# Altium integrated library Diode_Mos_Power_lib.IntLib: 39 symbols
Pins are listed as number, name and electrical type; pins without a type are passive.

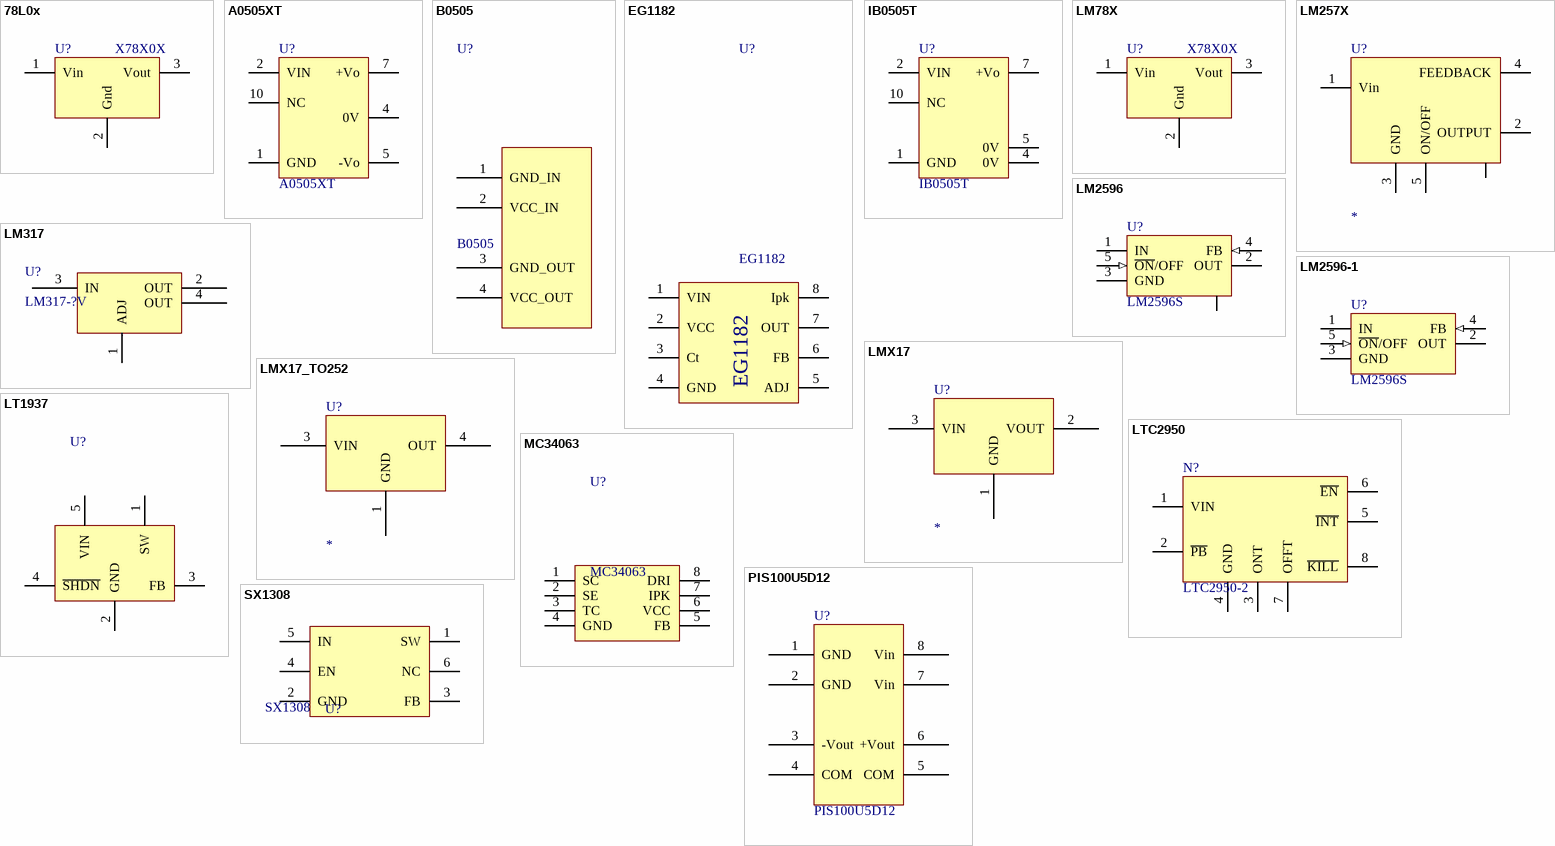
[diagram p0: symbols 78L0x to SX1308]

## 78L0x
designator U?, comment X78X0X
正电压等级转换器IC，电压等级有：5,6,8,9,12,15,24
footprint 7805
footprint TO-220
footprint lm7805
footprint SOT223
pins: 1 Vin, 2 Gnd, 3 Vout

## A0505XT
designator U?
隔离电源模块
footprint SO10_IB0505
pins: 1 GND, 2 VIN, 4 0V, 5 -Vo, 7 +Vo, 10 NC

## B0505
designator U?
隔离电源模块
footprint DC-DC_SIP4
pins: 1 GND_IN, 2 VCC_IN, 3 GND_OUT, 4 VCC_OUT
2 alternate drawings of the same symbol

## EG1182
designator U?
降压型开关电源
footprint SO-8_1
pins: 1 VIN, 2 VCC, 3 Ct, 4 GND, 5 ADJ, 6 FB, 7 OUT, 8 Ipk (power)

## IB0505T
designator U?
隔离电源模块
footprint SO10_IB0505
pins: 1 GND, 2 VIN, 4 0V, 5 0V, 7 +Vo, 10 NC

## LM78X
designator U?, comment X78X0X
三端稳压集成电路
footprint TO-252
pins: 1 Vin, 2 Gnd, 3 Vout

## LM257X
designator U?
开关稳压电源控制器
footprint LM2576
pins: 1 Vin, 2 OUTPUT, 3 GND, 4 FEEDBACK, 5 ON/OFF, 6 (power)

## LM317
designator U?, comment LM317-?V
三端稳压芯片(LDO); 价格: 1.05; 版本: 2015-V1.0; Value: LM317-?V
footprint SOT223-1
pins: 1 ADJ, 2 OUT, 3 IN, 4 OUT

## LM2596
designator U?, comment LM2596S
贴片稳压芯片(DC-DC); 价格: 3.5; 版本: 2015-V1.0; 品名: 降压稳压器; 封装: SOT-263-5; 生产厂家: *
footprint LM2576
pins: 1 IN (power), 2 OUT (power), 3 GND (power), 4 FB (in), 5 ~{ON}/OFF (in), 6 (power)

## LM2596-1
designator U?, comment LM2596S
直插稳压芯片(DC-DC); 价格: 3.5; 版本: 2015-V1.0; 品名: 降压稳压器; 封装: SOT-263-5; 生产厂家: *
footprint TO-220-5 (TO, Thru-Hole, Vertical, Heatsink Mounted; 5 In-Line Leads; Pitch 1.70 mm)
pins: 1 IN (power), 2 OUT (power), 3 GND (power), 4 FB (in), 5 ~{ON}/OFF (in)

## LMX17
designator U?
LM317/LM1117/
footprint SOT89
pins: 1 GND, 2 VOUT, 3 VIN

## LMX17_TO252
designator U?
LM317/LM1117/
footprint TO-252AA (D-PAK, 4-Leads, Body 6.1x6.5mm, Pitch 2.28mm, Lead Span 9.8mm, IPC Low Density)
pins: 1 GND, 3 VIN, 4 OUT

## LT1937
designator U?
开关型升压集成电路
footprint SOT-25-DBV
footprint SOT-23-5 - S
pins: 1 SW, 2 GND, 3 FB, 4 ~{SHDN}, 5 VIN

## LTC2950
designator N?, comment LTC2950-2
footprint LTC2950ITS8-2
pins: 1 VIN, 2 ~{PB}, 3 ONT, 4 GND, 5 ~{INT}, 6 ~{EN}, 7 OFFT, 8 ~{KILL}

## MC34063
designator U?
开关型稳压芯片
footprint SO-8 (SOIC)
footprint MC34063A-D
pins: 1 SC, 2 SE, 3 TC, 4 GND, 5 FB, 6 VCC, 7 IPK, 8 DRI

## PIS100U5D12
designator U?
5V转正负12V
footprint PSI100U5D12
pins: 1 GND, 2 GND, 3 -Vout, 4 COM, 5 COM, 6 +Vout, 7 Vin, 8 Vin
2 alternate drawings of the same symbol

## SX1308
designator U?
升压转换芯片
footprint SOT-23-6M
footprint SOT-236
pins: 1 SW, 2 GND, 3 FB, 4 EN, 5 IN, 6 NC


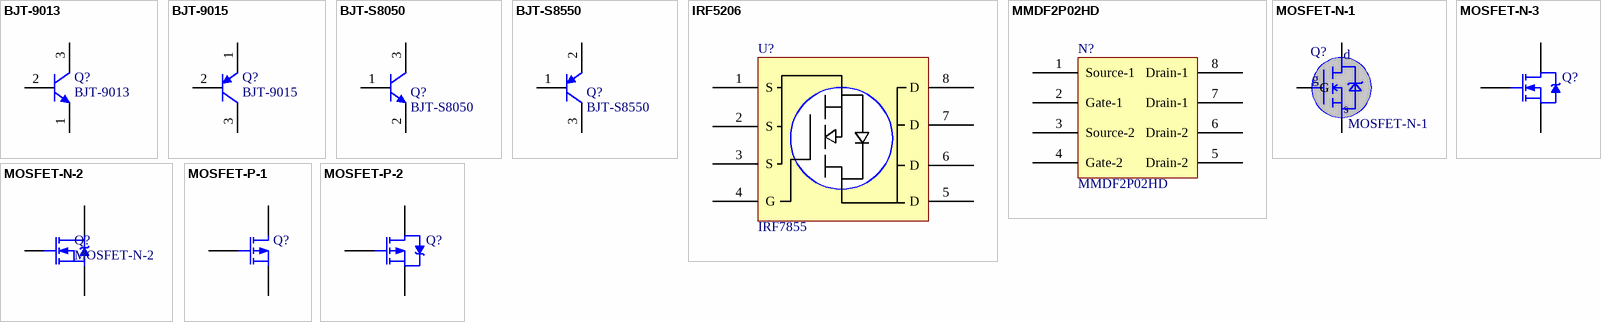
[diagram p1: symbols BJT-9013 to MOSFET-P-2]

## BJT-9013
designator Q?
NPN三极管; Published: 8-Jun-2000; LatestRevisionDate: 15-Jan-2003; LatestRevisionNote: PCB Footprint 'BCY-W3/D4.7' replaced; DatasheetDocument: 1997; PackageDocument: Sep-1998; PackageReference: TO-92A; Publisher: Altium Limited; Code_JEDEC: TO-92A; ComponentLink1Description: Manufacturer Link; ComponentLink1URL: http://www.fairchildsemi.com/; ComponentLink2Description: Datasheet; ComponentLink2URL: http://www.fairchildsemi.com/ds/2N%2F2N3904.pdf
footprint TO-92A (TO, Flat Index; 3 In-Line, Axial Leads; Body Dia. 4.5mm; Leads 0.51 x 0.48 mm (max))
pins: 1 E, 2 B, 3 C

## BJT-9015
designator Q?
PNP三极管; Published: 8-Jun-2000; LatestRevisionDate: 15-Jan-2003; LatestRevisionNote: PCB Footprint 'BCY-W3/D4.7' replaced; DatasheetDocument: 1997; PackageDocument: Sep-1998; PackageReference: TO-92A; Publisher: Altium Limited; Code_JEDEC: TO-92A; ComponentLink1Description: Manufacturer Link; ComponentLink1URL: http://www.fairchildsemi.com/; ComponentLink2Description: Datasheet; ComponentLink2URL: http://www.fairchildsemi.com/ds/2N%2F2N3906.pdf
footprint TO-92A (TO, Flat Index; 3 In-Line, Axial Leads; Body Dia. 4.5mm; Leads 0.51 x 0.48 mm (max))
pins: 1 E, 2 B, 3 C

## BJT-S8050
designator Q?
NPN三极管; Published: 8-Jun-2000; LatestRevisionDate: 15-Jan-2003; LatestRevisionNote: PCB Footprint 'BCY-W3/D4.7' replaced; DatasheetDocument: 1997; PackageDocument: Sep-1998; PackageReference: TO-92A; Publisher: Altium Limited; Code_JEDEC: TO-92A; ComponentLink1Description: Manufacturer Link; ComponentLink1URL: http://www.fairchildsemi.com/; ComponentLink2Description: Datasheet; ComponentLink2URL: http://www.fairchildsemi.com/ds/2N%2F2N3904.pdf
footprint SOT-23
pins: 1 B, 2 E, 3 C

## BJT-S8550
designator Q?
PNP三极管; Published: 8-Jun-2000; LatestRevisionDate: 15-Jan-2003; LatestRevisionNote: PCB Footprint 'BCY-W3/D4.7' replaced; DatasheetDocument: 1997; PackageDocument: Sep-1998; PackageReference: TO-92A; Publisher: Altium Limited; Code_JEDEC: TO-92A; ComponentLink1Description: Manufacturer Link; ComponentLink1URL: http://www.fairchildsemi.com/; ComponentLink2Description: Datasheet; ComponentLink2URL: http://www.fairchildsemi.com/ds/2N%2F2N3906.pdf
footprint SOT-23
pins: 1 B, 2 E, 3 C

## IRF5206
designator U?, comment IRF7855
N沟道MOSFET
footprint SO-8
pins: 1 S, 2 S, 3 S, 4 G, 5 D, 6 D, 7 D, 8 D
2 alternate drawings of the same symbol

## MMDF2P02HD
designator N?
footprint MMDF2P02HD
pins: 1 Source-1 (power), 2 Gate-1, 3 Source-2, 4 Gate-2, 5 Drain-2, 6 Drain-2, 7 Drain-1 (power), 8 Drain-1 (power)
2 alternate drawings of the same symbol

## MOSFET-N-1
designator Q?
N沟道MOSFET
footprint TO-220-LM
footprint TO220H
footprint TO-220-LM-3
footprint TO-263-AB
footprint TO-252
pins: 1 G, 2 D, 3 S
text: d; g; s

## MOSFET-N-2
designator Q?
N沟道MOSFET; PackageDocument: 1995/1996; Published: 8-Jun-2000; LatestRevisionDate: 17-Jul-2002; LatestRevisionNote: Re-released for DXP Platform.; PackageReference: E3; Publisher: Altium Limited
pins: D, G, S

## MOSFET-N-3
designator Q?
N-Channel Power MOSFET; Note: Pin 2 is electrically connected to pin 4.; Published: 8-Jun-2000; LatestRevisionDate: 17-Jul-2002; LatestRevisionNote: Re-released for DXP Platform.; DatasheetDocument: PD-9.814; PackageReference: TO-220AB; Publisher: Altium Limited; Code_JEDEC: TO-220-AB
footprint SOT-23-3
pins: 1 G, 2 S, 3 D

## MOSFET-P-1
designator Q?  (value not drawn)
P沟道MOSFET; PackageDocument: 1995/1996; Published: 8-Jun-2000; LatestRevisionDate: 17-Jul-2002; LatestRevisionNote: Re-released for DXP Platform.; PackageReference: E3; Publisher: Altium Limited
footprint TO-92
footprint TO92C
footprint TO-263-AB
footprint TO-252
pins: 1 G, 2 D, 3 S

## MOSFET-P-2
designator Q?
P-Channel Power MOSFET; Note: Pin 4 not drawn and electrically connected to Pin 2.; Published: 8-Jun-2000; LatestRevisionDate: 17-Jul-2002; LatestRevisionNote: Re-released for DXP Platform.; DatasheetDocument: PD-9.390D; PackageReference: TO-220AB; Publisher: Altium Limited; Code_JEDEC: TO-220-AB
footprint SOT-23-3
pins: 1 G, 2 S, 3 D


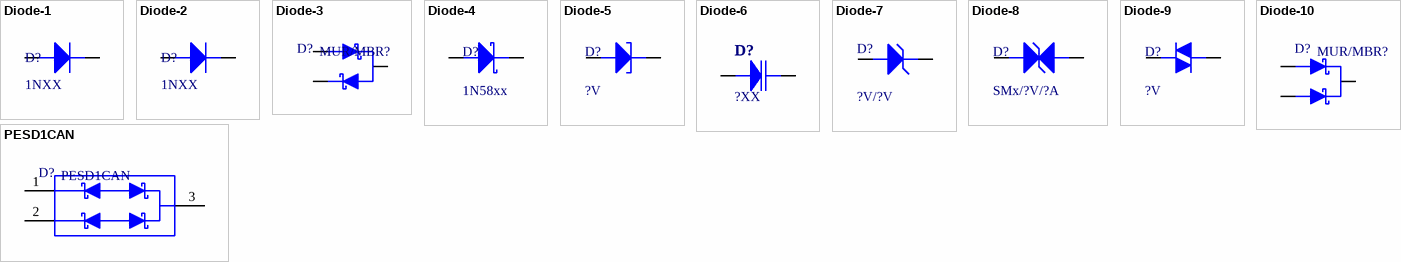
[diagram p2: symbols Diode-1 to PESD1CAN]

## Diode-1
designator D?, comment 1NXX
贴片式普通二极管; 版本: 2015-V1.0; 价格: 0.5; 精度: X; 品名: 贴片二极管; Value: 1NXX
footprint DIODE-SMA (贴片二极管)
footprint DIODE-SMB (贴片二极管)
footprint DIODE-SMC (贴片二极管)
footprint DIODE-1206 (玻璃封装二极管)
footprint D_6A/1000V
pins: 1, 2

## Diode-2
designator D?, comment 1NXX
直插式普通二极管; 版本: 2015-V1.0; 价格: 0.5; 精度: X; 品名: 直插二极管; Value: 1NXX
footprint DIODE-AXL (直插二极管)
footprint DO-41
pins: 1, 2

## Diode-3
designator D?, comment MUR/MBR?
双肖特基二极管（小信号）
footprint SOT-23-3
pins: 1 A, 2 K, 3 A

## Diode-4
designator D?, comment 1N58xx
贴片式肖特基二极管
footprint SMB-CA (TVS瞬变稳压二极管)
pins: 1, 2

## Diode-5
designator D?, comment ?V
隧道二极管; Text Field1: 20; Text Field2: 20
footprint D1206
pins: 1, 2

## Diode-6
designator D?, comment ?XX
变容二极管
pins: 1, 2

## Diode-7
designator D?, comment ?V/?V
稳压二极管，齐纳二极管
footprint SOD-123_1206
pins: 1, 2

## Diode-8
designator D?, comment SMx/?V/?A
瞬态抑制二极管
footprint DIODE-SMA (贴片二极管)
pins: 1, 2

## Diode-9
designator D?, comment ?V
双向触发二极管
footprint DIODE-AXL (直插二极管)
pins: 1, 2

## Diode-10
designator D?, comment MUR/MBR?
共阴开关二极管
footprint TO-220
pins: 1 A, 2 K, 3 A

## PESD1CAN
designator D?
总线瞬态抑制二极管
footprint SOT-23P
pins: 1 A, 2 A, 3 K